# Altium footprint library Connector.PcbLib: 536 footprints (part 19 of 34)
Each footprint in its own frame and in the unit in brackets; x right, y up, seen from the top. Pads: shape width x height; smd on the part's side, far side on the other; paste and mask are expansions set on the pad; w line width, h text height; cw(c..) or ccw(c..) is an arc to the next point about the centre after c.
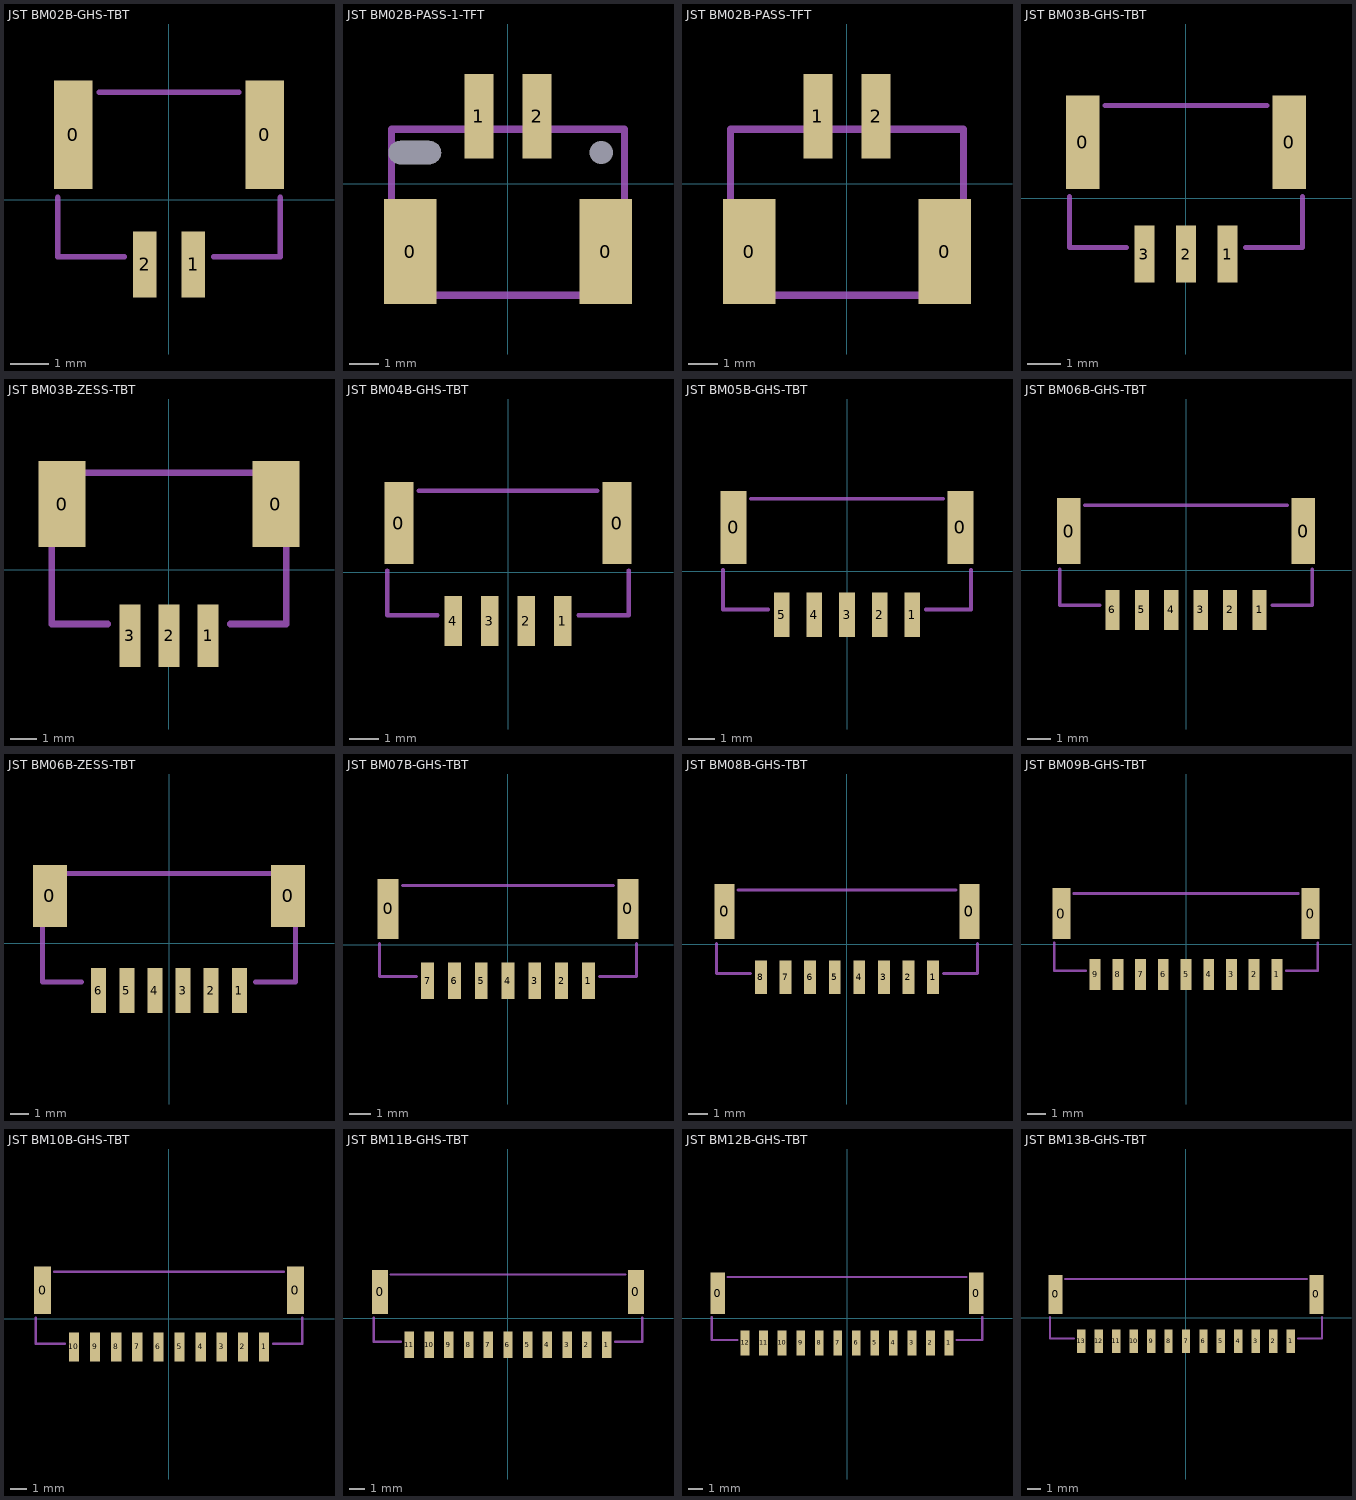
[diagram p18: the footprints below, top view; thin cyan lines are the x and y axes]

## JST BM02B-GHS-TBT [mm]
pads (4):
  rect 1x2.8 smd: 0(-2.475,1.675) 0(2.475,1.675)
  rect 0.6x1.7 smd: 1(0.625,-1.675) 2(-0.625,-1.675)
Mechanical 15:
  lines w0.15: -2.875,0.052 -2.875,-1.475 -1.158,-1.475 ; -1.8,2.775 1.8,2.775 ; 1.158,-1.475 2.875,-1.475 2.875,0.052
3D body "BM02B-GHS-TBT.STEP": height 4.23, standoff 0.02, extent -2.875,-2.175 2.875,2.775

## JST BM02B-PASS-1-TFT [mm]
pads (6):
  rect 1.8x3.6 smd: 0(-3.35,-2.325) 0(3.35,-2.325)
  rect 1x2.9 smd: 1(-1,2.325) 2(1,2.325)
  round 0.5 hole 0.8 slot 1.8 at 0 deg: ""(-3.2,1.075)
  round 0.5 hole 0.8: ""(3.2,1.075)
Mechanical 15:
  lines w0.254: -4,-3.825 -4,1.875 4,1.875 4,-3.825 -4,-3.825
3D body "BM02B-PASS-TF.STEP": height 9, standoff 0, extent -4,-3.825 4,3.274

## JST BM02B-PASS-TFT [mm]
pads (4):
  rect 1.8x3.6 smd: 0(-3.35,-2.325) 0(3.35,-2.325)
  rect 1x2.9 smd: 1(-1,2.325) 2(1,2.325)
Mechanical 15:
  lines w0.254: -4,-3.825 -4,1.875 4,1.875 4,-3.825 -4,-3.825
3D body "BM02B-PASS-TF.STEP": height 9, standoff 0, extent -4,-3.825 4,3.274

## JST BM03B-GHS-TBT [mm]
pads (5):
  rect 1x2.8 smd: 0(-3.1,1.675) 0(3.1,1.675)
  rect 0.6x1.7 smd: 1(1.25,-1.675) 2(0,-1.675) 3(-1.25,-1.675)
Mechanical 15:
  lines w0.15: -3.5,0.052 -3.5,-1.475 -1.783,-1.475 ; -2.425,2.775 2.423,2.775 ; 1.783,-1.475 3.5,-1.475 3.5,0.052
3D body "BM03B-GHS-TBT.STEP": height 4.23, standoff 0.02, extent -3.5,-2.175 3.5,2.775

## JST BM03B-ZESS-TBT [mm]
pads (5):
  rect 1.8x3.3 smd: 0(-4.1,2.525) 0(4.1,2.525)
  rect 0.8x2.4 smd: 1(1.5,-2.525) 2(0,-2.525) 3(-1.5,-2.525)
Mechanical 15:
  lines w0.254: -2.35,-2.075 -4.5,-2.075 -4.5,3.725 4.5,3.725 4.5,-2.075 2.35,-2.075
3D body "BM03B-ZESS-TBT.STEP": height 7.6, standoff 0, extent -4.5,-3.274 4.5,3.726

## JST BM04B-GHS-TBT [mm]
pads (6):
  rect 1x2.8 smd: 0(-3.725,1.675) 0(3.725,1.675)
  rect 0.6x1.7 smd: 1(1.875,-1.675) 2(0.625,-1.675) 3(-0.625,-1.675) 4(-1.875,-1.675)
Mechanical 15:
  lines w0.15: -4.125,0.052 -4.125,-1.475 -2.408,-1.475 ; -3.05,2.775 1.798,2.775 ; -1.798,2.775 3.05,2.775 ; 2.408,-1.475 4.125,-1.475 4.125,0.052
3D body "BM04B-GHS-TBT.STEP": height 4.23, standoff 0.02, extent -4.125,-2.175 4.125,2.775

## JST BM05B-GHS-TBT [mm]
pads (7):
  rect 1x2.8 smd: 0(-4.35,1.675) 0(4.35,1.675)
  rect 0.6x1.7 smd: 1(2.5,-1.675) 2(1.25,-1.675) 3(0,-1.675) 4(-1.25,-1.675) 5(-2.5,-1.675)
Mechanical 15:
  lines w0.15: -4.75,0.052 -4.75,-1.475 -3.033,-1.475 ; -3.675,2.775 1.173,2.775 ; -2.423,2.775 2.425,2.775 ; -1.173,2.775 3.675,2.775 ; 3.033,-1.475 4.75,-1.475 4.75,0.052
3D body "BM05B-GHS-TBT.STEP": height 4.23, standoff 0.02, extent -4.75,-2.175 4.75,2.775

## JST BM06B-GHS-TBT [mm]
pads (8):
  rect 1x2.8 smd: 0(-4.975,1.675) 0(4.975,1.675)
  rect 0.6x1.7 smd: 1(3.125,-1.675) 2(1.875,-1.675) 3(0.625,-1.675) 4(-0.625,-1.675) 5(-1.875,-1.675) 6(-3.125,-1.675)
Mechanical 15:
  lines w0.15: -5.375,0.052 -5.375,-1.475 -3.658,-1.475 ; -4.3,2.775 0.548,2.775 ; -3.048,2.775 1.8,2.775 ; -1.798,2.775 3.05,2.775 ; -0.548,2.775 4.3,2.775 ; 3.658,-1.475 5.375,-1.475 5.375,0.052
3D body "BM06B-GHS-TBT.STEP": height 4.23, standoff 0.02, extent -5.375,-2.175 5.375,2.775

## JST BM06B-ZESS-TBT [mm]
pads (8):
  rect 1.8x3.3 smd: 0(-6.35,2.525) 0(6.35,2.525)
  rect 0.8x2.4 smd: 1(3.75,-2.525) 2(2.25,-2.525) 3(0.75,-2.525) 4(-0.75,-2.525) 5(-2.25,-2.525) 6(-3.75,-2.525)
Mechanical 15:
  lines w0.254: -4.65,-2.075 -6.75,-2.075 -6.75,3.723 -6.748,3.725 6.75,3.725 6.75,-2.075 4.6,-2.075
3D body "BM06B-ZESS-TBT.STEP": height 7.6, standoff 0, extent -6.75,-3.275 6.75,3.725

## JST BM07B-GHS-TBT [mm]
pads (9):
  rect 1x2.8 smd: 0(-5.6,1.675) 0(5.6,1.675)
  rect 0.6x1.7 smd: 1(3.75,-1.675) 2(2.5,-1.675) 3(1.25,-1.675) 4(0,-1.675) 5(-1.25,-1.675) 6(-2.5,-1.675) 7(-3.75,-1.675)
Mechanical 15:
  lines w0.15: -6,0.052 -6,-1.475 -4.283,-1.475 ; -4.925,2.775 -0.077,2.775 ; -3.673,2.775 1.175,2.775 ; -2.423,2.775 2.425,2.775 ; -1.173,2.775 3.675,2.775 ; 0.077,2.775 4.925,2.775 ; 4.283,-1.475 6,-1.475 6,0.052
3D body "BM07B-GHS-TBT.STEP": height 4.23, standoff 0.02, extent -6,-2.175 6,2.775

## JST BM08B-GHS-TBT [mm]
pads (10):
  rect 1x2.8 smd: 0(-6.225,1.675) 0(6.225,1.675)
  rect 0.6x1.7 smd: 1(4.375,-1.675) 2(3.125,-1.675) 3(1.875,-1.675) 4(0.625,-1.675) 5(-0.625,-1.675) 6(-1.875,-1.675) 7(-3.125,-1.675) 8(-4.375,-1.675)
Mechanical 15:
  lines w0.15: -6.625,0.052 -6.625,-1.475 -4.908,-1.475 ; -5.55,2.775 -0.702,2.775 ; -4.298,2.775 0.55,2.775 ; -3.048,2.775 1.8,2.775 ; -1.798,2.775 3.05,2.775 ; -0.548,2.775 4.3,2.775 ; 0.702,2.775 5.55,2.775 ; 4.908,-1.475 6.625,-1.475 6.625,0.052
3D body "BM08B-GHS-TBT.STEP": height 4.23, standoff 0.02, extent -6.625,-2.175 6.625,2.775

## JST BM09B-GHS-TBT [mm]
pads (11):
  rect 1x2.8 smd: 0(-6.85,1.675) 0(6.85,1.675)
  rect 0.6x1.7 smd: 1(5,-1.675) 2(3.75,-1.675) 3(2.5,-1.675) 4(1.25,-1.675) 5(0,-1.675) 6(-1.25,-1.675) 7(-2.5,-1.675) 8(-3.75,-1.675) 9(-5,-1.675)
Mechanical 15:
  lines w0.15: -7.25,0.052 -7.25,-1.475 -5.533,-1.475 ; -6.175,2.775 -1.327,2.775 ; -4.923,2.775 -0.075,2.775 ; -3.673,2.775 1.175,2.775 ; -2.423,2.775 2.425,2.775 ; -1.173,2.775 3.675,2.775 ; 0.077,2.775 4.925,2.775 ; 1.327,2.775 6.175,2.775 ; 5.533,-1.475 7.25,-1.475 7.25,0.052
3D body "BM09B-GHS-TBT.STEP": height 4.23, standoff 0.02, extent -7.25,-2.175 7.25,2.775

## JST BM10B-GHS-TBT [mm]
pads (12):
  rect 1x2.8 smd: 0(-7.475,1.675) 0(7.475,1.675)
  rect 0.6x1.7 smd: 1(5.625,-1.675) 2(4.375,-1.675) 3(3.125,-1.675) 4(1.875,-1.675) 5(0.625,-1.675) 6(-0.625,-1.675) 7(-1.875,-1.675) 8(-3.125,-1.675) 9(-4.375,-1.675) 10(-5.625,-1.675)
Mechanical 15:
  lines w0.15: -7.875,0.052 -7.875,-1.475 -6.158,-1.475 ; -6.8,2.775 -1.952,2.775 ; -5.548,2.775 -0.7,2.775 ; -4.298,2.775 0.55,2.775 ; -3.048,2.775 1.8,2.775 ; -1.798,2.775 3.05,2.775 ; -0.548,2.775 4.3,2.775 ; 0.702,2.775 5.55,2.775 ; 1.952,2.775 6.8,2.775 ; 6.158,-1.475 7.875,-1.475 7.875,0.052
3D body "BM10B-GHS-TBT.STEP": height 4.23, standoff 0.02, extent -7.875,-2.175 7.875,2.775

## JST BM11B-GHS-TBT [mm]
pads (13):
  rect 1x2.8 smd: 0(-8.1,1.675) 0(8.1,1.675)
  rect 0.6x1.7 smd: 1(6.25,-1.675) 2(5,-1.675) 3(3.75,-1.675) 4(2.5,-1.675) 5(1.25,-1.675) 6(0,-1.675) 7(-1.25,-1.675) 8(-2.5,-1.675) 9(-3.75,-1.675) 10(-5,-1.675) 11(-6.25,-1.675)
Mechanical 15:
  lines w0.15: -8.5,0.052 -8.5,-1.475 -6.783,-1.475 ; -7.425,2.775 -2.577,2.775 ; -6.173,2.775 -1.325,2.775 ; -4.923,2.775 -0.075,2.775 ; -3.673,2.775 1.175,2.775 ; -2.423,2.775 2.425,2.775 ; -1.173,2.775 3.675,2.775 ; 0.077,2.775 4.925,2.775 ; 1.327,2.775 6.175,2.775 ; 2.577,2.775 7.425,2.775 ; 6.783,-1.475 8.5,-1.475 8.5,0.052
3D body "BM11B-GHS-TBT.STEP": height 4.23, standoff 0.02, extent -8.5,-2.175 8.5,2.775

## JST BM12B-GHS-TBT [mm]
pads (14):
  rect 1x2.8 smd: 0(-8.725,1.675) 0(8.725,1.675)
  rect 0.6x1.7 smd: 1(6.875,-1.675) 2(5.625,-1.675) 3(4.375,-1.675) 4(3.125,-1.675) 5(1.875,-1.675) 6(0.625,-1.675) 7(-0.625,-1.675) 8(-1.875,-1.675) 9(-3.125,-1.675) 10(-4.375,-1.675) 11(-5.625,-1.675) 12(-6.875,-1.675)
Mechanical 15:
  lines w0.15: -9.125,0.052 -9.125,-1.475 -7.408,-1.475 ; -8.05,2.775 -3.202,2.775 ; -6.798,2.775 -1.95,2.775 ; -5.548,2.775 -0.7,2.775 ; -4.298,2.775 0.55,2.775 ; -3.048,2.775 1.8,2.775 ; -1.798,2.775 3.05,2.775 ; -0.548,2.775 4.3,2.775 ; 0.702,2.775 5.55,2.775 ; 1.952,2.775 6.8,2.775 ; 3.202,2.775 8.05,2.775 ; 7.408,-1.475 9.125,-1.475 9.125,0.052
3D body "BM12B-GHS-TBT.STEP": height 4.23, standoff 0.02, extent -9.125,-2.175 9.125,2.775

## JST BM13B-GHS-TBT [mm]
pads (15):
  rect 1x2.8 smd: 0(-9.35,1.675) 0(9.35,1.675)
  rect 0.6x1.7 smd: 1(7.5,-1.675) 2(6.25,-1.675) 3(5,-1.675) 4(3.75,-1.675) 5(2.5,-1.675) 6(1.25,-1.675) 7(0,-1.675) 8(-1.25,-1.675) 9(-2.5,-1.675) 10(-3.75,-1.675) 11(-5,-1.675) 12(-6.25,-1.675) 13(-7.5,-1.675)
Mechanical 15:
  lines w0.15: -9.75,0.052 -9.75,-1.475 -8.033,-1.475 ; -8.675,2.775 -3.827,2.775 ; -7.423,2.775 -2.575,2.775 ; -6.173,2.775 -1.325,2.775 ; -4.923,2.775 -0.075,2.775 ; -3.673,2.775 1.175,2.775 ; -2.423,2.775 2.425,2.775 ; -1.173,2.775 3.675,2.775 ; 0.077,2.775 4.925,2.775 ; 1.327,2.775 6.175,2.775 ; 2.577,2.775 7.425,2.775 ; 3.827,2.775 8.675,2.775 ; 8.033,-1.475 9.75,-1.475 9.75,0.052
3D body "BM13B-GHS-TBT.STEP": height 4.23, standoff 0.02, extent -9.75,-2.175 9.75,2.775